# Altium footprint library eLIB.PcbLib: 206 footprints (part 2 of 13)
Each footprint in its own frame and in the unit in brackets; x right, y up, seen from the top. Pads: shape width x height; smd on the part's side, far side on the other; paste and mask are expansions set on the pad; w line width, h text height; cw(c..) or ccw(c..) is an arc to the next point about the centre after c.
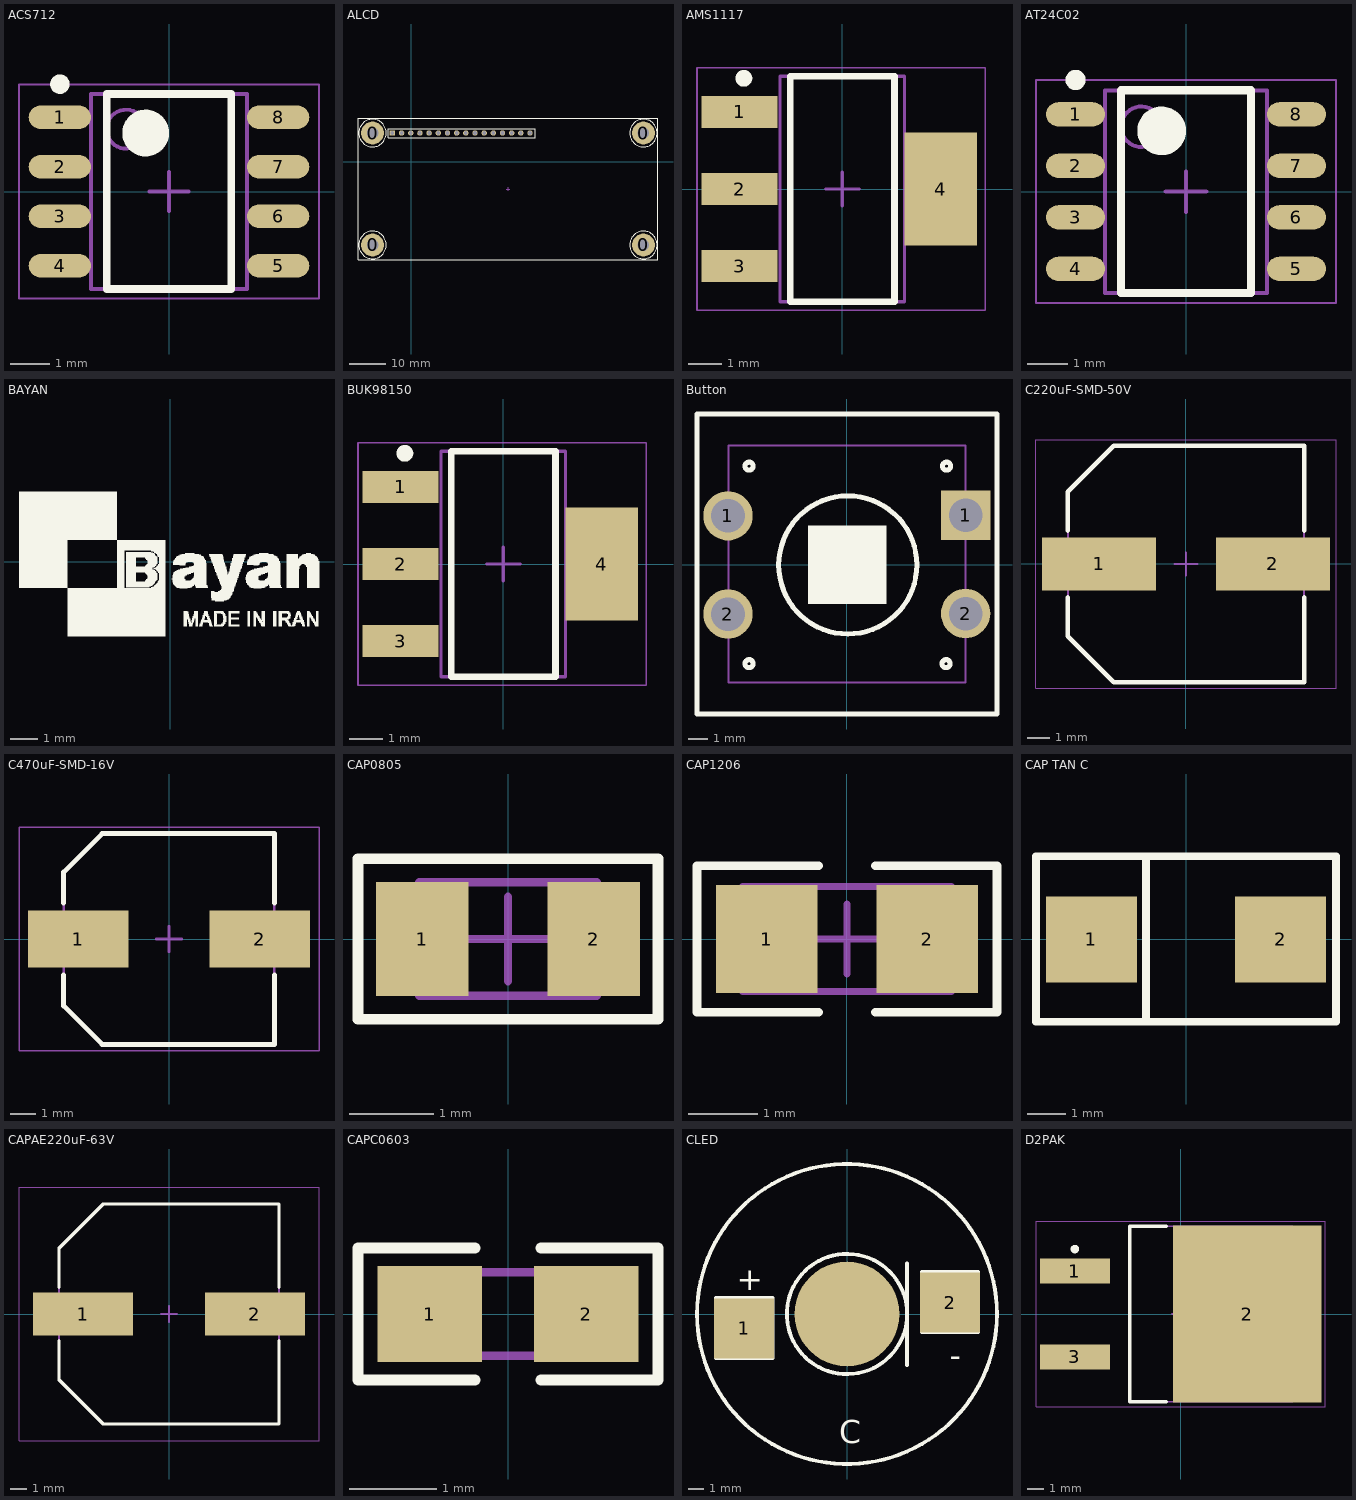
[diagram p1: the footprints below, top view; thin cyan lines are the x and y axes]

## ACS712 [mm] "SOIC, 8-Leads, Body 4.90x3.90mm, Pitch 1.27mm, IPC Medium Density"
height 1.75
pads (8):
  oval 1.6x0.6 smd: 1(-2.8,1.905) 2(-2.8,0.635) 3(-2.8,-0.635) 4(-2.8,-1.905) 5(2.8,-1.905) 6(2.8,-0.635) 7(2.8,0.635) 8(2.8,1.905)
Top Overlay:
  circle w0.25: c-2.8,2.755 r0.125
  circle w0.6: c-0.6,1.5 r0.3
  lines w0.2: -1.6,-2.5 -1.6,2.5 1.6,2.5 1.6,-2.5 -1.6,-2.5
Mechanical 13:
  circle w0.1: c-1.1,1.6 r0.5
  lines w0.1: -2,-2.5 -2,2.5 2,2.5 2,-2.5 -2,-2.5
Mechanical 15:
  lines w0.05: -3.85,-2.75 -3.85,2.75 3.85,2.75 3.85,-2.75 -3.85,-2.75
  lines w0.1: -0.5,0 0.5,0 ; 0,-0.5 0,0.5
3D body: height 1.75, standoff 0.2, extent -2,-2.5 2,2.5

## ALCD [mm]
pads (20):
  round 6.35 hole 3.2: 0(-10.77,-23.017) 0(-10.77,7.983) 0(64.23,-23.017) 0(64.23,7.983)
  rect 1.5x1.5 hole 1: 1(-5.27,7.983)
  round 1.5 hole 1: 2(-2.73,7.983) 3(-0.19,7.983) 4(2.35,7.983) 5(4.89,7.983) 6(7.43,7.983) 7(9.97,7.983) 8(12.51,7.983) 9(15.05,7.983) 10(17.59,7.983) 11(20.13,7.983) 12(22.67,7.983) 13(25.21,7.983) 14(27.75,7.983) 15(30.29,7.983) 16(32.83,7.983)
Top Overlay:
  circle w0.127: c64.23,7.983 r3.81
  circle w0.127: c64.23,-23.017 r3.81
  circle w0.127: c-10.77,-23.017 r3.81
  circle w0.127: c-10.77,7.983 r3.81
  lines w0.2: -14.799,-27.075 68.259,-27.075 68.259,12.041 -14.799,12.041 -14.799,-27.075 ; -6.379,6.68 34.261,6.68 34.261,9.22 -6.379,9.22 -6.379,6.68
Mechanical 15:
  lines w0.1: 26.23,-7.517 27.23,-7.517 ; 26.73,-8.017 26.73,-7.017
3D body "User Library-LCD-5.STEP": height 24.8, standoff 6.5, extent -13.396,-25.644 66.604,10.356
3D body "14801-15 H.STEP": height 18.71, standoff -3.71, extent 61.93,-25.317 66.53,-20.717
3D body "14801-15 H.STEP": height 18.71, standoff -3.71, extent 61.93,5.683 66.53,10.283
3D body "14801-15 H.STEP": height 18.71, standoff -3.71, extent -13.07,5.683 -8.47,10.283
3D body "14801-15 H.STEP": height 18.71, standoff -3.71, extent -13.07,-25.317 -8.47,-20.717
3D body "PBD-2.stp": height 8.5, standoff -3.15, extent -6.54,6.713 -1.46,9.253
3D body "PBD-2.stp": height 8.5, standoff -3.15, extent -1.46,6.713 3.62,9.253
3D body "PBD-2.stp": height 8.5, standoff -3.15, extent 3.62,6.713 8.7,9.253
3D body "PBD-2.stp": height 8.5, standoff -3.15, extent 8.7,6.713 13.78,9.253
3D body "PBD-2.stp": height 8.5, standoff -3.15, extent 13.78,6.713 18.86,9.253
3D body "PBD-2.stp": height 8.5, standoff -3.15, extent 18.86,6.713 23.94,9.253
3D body "PBD-2.stp": height 8.5, standoff -3.15, extent 23.94,6.713 29.02,9.253
3D body "PBD-2.stp": height 8.5, standoff -3.15, extent 29.02,6.713 34.1,9.253

## AMS1117 [mm]
pads (4):
  rect 2.25x0.95 smd: 1(-3.052,2.29) 2(-3.052,0) 3(-3.052,-2.29)
  rect 2.15x3.35 smd: 4(2.925,0)
Top Overlay:
  circle w0.25: c-2.925,3.29 r0.125
  lines w0.2: -1.55,-3.35 1.55,-3.35 1.55,3.35 -1.55,3.35 -1.55,-3.35
Mechanical 13:
  lines w0.1: -1.85,-3.35 1.85,-3.35 1.85,3.35 -1.85,3.35 -1.85,-3.35
Mechanical 15:
  lines w0.05: -4.318,-3.6 4.25,-3.6 4.25,3.6 -4.318,3.6 -4.318,-3.6
  lines w0.1: -0.5,0 0.5,0 ; 0,-0.5 0,0.5
3D body "User Library-AMS1117.STEP": height 1.85, standoff -0.01, extent -3.67,-3.25 3.33,3.25

## AT24C02 [mm] "SOIC, 8-Leads, Body 4.90x3.90mm, Pitch 1.27mm, IPC Medium Density"
height 1.75
pads (8):
  oval 1.45x0.6 smd: 1(-2.725,1.905) 2(-2.725,0.635) 3(-2.725,-0.635) 4(-2.725,-1.905) 5(2.725,-1.905) 6(2.725,-0.635) 7(2.725,0.635) 8(2.725,1.905)
Top Overlay:
  circle w0.25: c-2.725,2.755 r0.125
  circle w0.6: c-0.6,1.5 r0.3
  lines w0.2: -1.6,-2.5 -1.6,2.5 1.6,2.5 1.6,-2.5 -1.6,-2.5
Mechanical 13:
  circle w0.1: c-1.1,1.6 r0.5
  lines w0.1: -2,-2.5 -2,2.5 2,2.5 2,-2.5 -2,-2.5
Mechanical 15:
  lines w0.05: -3.7,-2.75 -3.7,2.75 3.7,2.75 3.7,-2.75 -3.7,-2.75
  lines w0.1: -0.5,0 0.5,0 ; 0,-0.5 0,0.5
3D body "LM358.step": height 1.35, standoff 0, extent -3.25,-2.5 3.25,2.5

## BAYAN [mm]
Top Overlay:
  drawing of 868 lines, arcs and shapes, not listed

## BUK98150 [mm]
pads (4):
  rect 2.25x0.95 smd: 1(-3.052,2.29) 2(-3.052,0) 3(-3.052,-2.29)
  rect 2.15x3.35 smd: 4(2.925,0)
Top Overlay:
  circle w0.25: c-2.925,3.29 r0.125
  lines w0.2: -1.55,-3.35 1.55,-3.35 1.55,3.35 -1.55,3.35 -1.55,-3.35
Mechanical 13:
  lines w0.1: -1.85,-3.35 1.85,-3.35 1.85,3.35 -1.85,3.35 -1.85,-3.35
Mechanical 15:
  lines w0.05: -4.318,-3.6 4.25,-3.6 4.25,3.6 -4.318,3.6 -4.318,-3.6
  lines w0.1: -0.5,0 0.5,0 ; 0,-0.5 0,0.5
3D body: height 1.8, standoff 0.02, extent -1.85,-3.35 1.85,3.35

## Button [mm]
pads (4):
  round 2.5 hole 1.7: 1(-6.02,2.476) 2(-6.02,-2.502) 2(6.02,-2.476)
  rect 2.5x2.5 hole 1.7: 1(6.02,2.502)
Top Overlay:
  circle w0.254: c-4.951,-5.016 r0.205
  circle w0.254: c-4.951,4.991 r0.205
  circle w0.254: c5.031,-5.016 r0.205
  circle w0.254: c5.056,4.991 r0.205
  circle w0.254: c0.051,-0.013 r3.5
  region: 2.011,1.994 -1.977,1.994 -1.977,-1.994 2.011,-1.994
  lines w0.254: -7.59,-7.565 7.61,-7.565 7.61,7.635 -7.59,7.635 -7.59,-7.565
Mechanical 13:
  lines w0.1: -5.99,-5.965 -5.99,6.035 6.01,6.035 6.01,-5.965 -5.99,-5.965
3D body: height 4, standoff 0.02, extent -5.959,-5.934 5.979,6.004
3D body: height 15, standoff 0, extent -3.423,-3.529 3.57,3.471

## C220uF-SMD-50V [mm] "Aluminum Electrolytic Capacitor, Body 10.35x10.35x10.50mm, IPC Low Density"
height 10.5
pads (2):
  rect 5x2.35 smd: 1(-3.829,0) 2(3.829,0)
Top Overlay:
  lines w0.2: -5.2,-1.475 -5.2,-3.188 -3.187,-5.2 5.2,-5.2 5.2,-1.475 ; -5.2,1.475 -5.2,3.187 -3.187,5.2 5.2,5.2 5.2,1.475
Mechanical 13:
  lines w0.1: -5.2,-3.188 -5.2,3.187 -3.187,5.2 5.2,5.2 5.2,-5.2 -3.187,-5.2 -5.2,-3.188
Mechanical 15:
  lines w0.05: -6.604,-5.461 6.604,-5.461 6.604,5.461 -6.604,5.461 -6.604,-5.461
  lines w0.1: -0.5,0 0.5,0 ; 0,-0.5 0,0.5
3D body: height 10.5, standoff 0, extent -4.98,-4.98 4.98,4.98
3D body: height 3.5, standoff 0, extent -5.2,-5.2 5.2,5.2

## C470uF-SMD-16V [mm] "Chip Capacitor, 2-Leads, Body 7.25x4.15mm, IPC Medium Density"
height 4
pads (2):
  rect 4x2.25 smd: 1(-3.608,0) 2(3.608,0)
Top Overlay:
  lines w0.2: -4.19,-1.425 -4.19,-2.658 -2.657,-4.19 4.19,-4.19 4.19,-1.425 ; -4.19,1.425 -4.19,2.657 -2.657,4.19 4.19,4.19 4.19,1.425
Mechanical 13:
  lines w0.1: -4.19,-2.658 -2.657,-4.19 4.19,-4.19 4.19,4.19 -2.657,4.19 -4.19,2.657 -4.19,-2.658
Mechanical 15:
  lines w0.05: -5.969,-4.445 -5.969,4.445 5.969,4.445 5.969,-4.445 -5.969,-4.445
  lines w0.1: -0.5,0 0.5,0 ; 0,-0.5 0,0.5
3D body: height 3.5, standoff 0, extent -4.19,-4.19 4.19,4.19
3D body: height 10.6, standoff 0, extent -4.05,-4.05 4.05,4.044

## CAP0805 [mm] "Chip Resistor, 2-Leads, Body 2.00x1.25mm, IPC Medium Density"
height 0.6
pads (2):
  rect 1.1x1.35 smd: 1(-1.016,0) 2(1.016,0)
Top Overlay:
  lines w0.127: -1.778,-0.95 1.778,-0.95 1.778,0.95 -1.778,0.95 -1.778,-0.95
Mechanical 13:
  lines w0.1: -1.05,-0.675 -1.05,0.675 1.05,0.675 1.05,-0.675 -1.05,-0.675
Mechanical 15:
  lines w0.1: -0.5,0 0.5,0 ; 0,-0.5 0,0.5
3D body: height 0.6, standoff 0, extent -0.7,-0.675 0.7,0.675
3D body: height 0.6, standoff 0, extent -1.05,-0.675 -0.7,0.675
3D body: height 0.6, standoff 0, extent 0.7,-0.675 1.05,0.675

## CAP1206 [mm]
pads (2):
  rect 1.45x1.55 smd: 1(-1.15,0) 2(1.15,0)
Top Overlay:
  lines w0.127: -0.41,-1.05 -2.15,-1.05 -2.15,1.05 -0.41,1.05 ; 0.41,-1.05 2.15,-1.05 2.15,1.05 0.41,1.05
Mechanical 13:
  lines w0.1: -1.5,-0.75 1.5,-0.75 1.5,0.75 -1.5,0.75 -1.5,-0.75
Mechanical 15:
  lines w0.1: -0.5,0 0.5,0 ; 0,-0.5 0,0.5
3D body: height 1.5, standoff 0, extent 0.55,-0.75 1.5,0.75
3D body: height 1.5, standoff 0, extent -1.5,-0.75 -0.55,0.75
3D body: height 1.5, standoff 0, extent -0.55,-0.75 0.55,0.75

## CAP TAN C [mm] "tantalum capacitor c package"
pads (2):
  rect 2.37x2.23 smd: 1(-2.46,0) 2(2.46,0)
Top Overlay:
  lines w0.2: -1.04,-2.12 -1.04,2.16 ; -3.9,-2.14 3.9,-2.14 3.9,2.16 -3.9,2.16 -3.9,-2.14
3D body "cap tantalum type C.stp": height 2.81, standoff 0.01, extent -3.1,-1.725 3.2,1.775

## CAPAE220uF-63V [mm] "Aluminum Electrolytic Capacitor, Body 13.10x13.10x13.50mm, IPC Low Density"
height 13.5
pads (2):
  rect 6x2.6 smd: 1(-5.15,0) 2(5.15,0)
Top Overlay:
  lines w0.2: -6.6,-1.6 -6.6,-3.95 -3.95,-6.6 6.6,-6.6 6.6,-1.6 ; -6.6,1.6 -6.6,3.95 -3.95,6.6 6.6,6.6 6.6,1.6
Mechanical 13:
  lines w0.1: -6.6,-3.95 -3.95,-6.6 6.6,-6.6 6.6,6.6 -3.95,6.6 -6.6,3.95 -6.6,-3.95
Mechanical 15:
  lines w0.05: -9,-7.6 -9,7.6 9,7.6 9,-7.6 -9,-7.6
  lines w0.1: -0.5,0 0.5,0 ; 0,-0.5 0,0.5
3D body: height 4.5, standoff 0, extent -6.6,-6.6 6.6,6.6
3D body: height 13.5, standoff 0, extent -6.5,-6.5 6.5,6.5

## CAPC0603 [mm]
pads (2):
  rect 1.2x1.1 smd: 1(-0.9,0) 2(0.9,0)
Top Overlay:
  lines w0.127: -0.381,-0.762 -1.727,-0.762 -1.727,0.762 -0.381,0.762 ; 0.381,-0.762 1.727,-0.762 1.727,0.762 0.381,0.762
Mechanical 13:
  lines w0.1: -0.867,-0.482 0.893,-0.482 0.893,0.483 -0.867,0.483 -0.867,-0.482
3D body: height 0.6, standoff 0, extent 0.543,-0.482 0.893,0.483
3D body: height 0.6, standoff 0, extent -0.872,-0.472 -0.522,0.483
3D body: height 0.6, standoff 0, extent -0.522,-0.482 0.543,0.483

## CLED [mm]
pads (3):
  rect 4x4 smd: 1(-6.858,-0.965) 2(6.883,0.762)
  round 7 smd: ""(0,0)
Top Overlay:
  circle w0.254: c0,0 r10.008
  circle w0.254: c0,0 r4.013
  lines w0.254: 4.013,-3.404 4.013,3.383 ; -8.738,-2.946 -4.978,-2.946 -4.978,1.067 -8.738,1.067 -8.738,-2.946 ; 5.004,-1.219 8.763,-1.219 8.763,2.794 5.004,2.794 5.004,-1.219
  text "C" at -0.508,-8.636 h1.52
  text "+" at -7.366,1.575 h1.52
  text "-" at 6.858,-3.505 h1.52
3D body "SW3dPS-Power LED2.STEP": height 5.55, standoff 0, extent -7.23,-4.11 7.27,3.89

## D2PAK [mm] "D2-PAK, 3-Pads, Body 7.93x8.57mm (max), IPC Medium Density"
height 4.83
pads (3):
  rect 4.15x1.5 smd: 1(-6.25,2.54) 3(-6.25,-2.54)
  rect 8.8x10.5 smd: 2(3.95,0)
Top Overlay:
  circle w0.25: c-6.25,3.84 r0.125
  lines w0.2: -0.85,-5.2 -3,-5.2 -3,5.2 -0.85,5.2
Mechanical 13:
  lines w0.1: -3,-5.2 6.65,-5.2 6.65,5.2 -3,5.2 -3,-5.2
Mechanical 15:
  lines w0.05: -8.55,-5.5 8.55,-5.5 8.55,5.5 -8.55,5.5 -8.55,-5.5
  lines w0.1: -0.5,0 0.5,0 ; 0,-0.5 0,0.5
3D body: height 4.83, standoff 0, extent -3,-5.2 6.65,5.2